# Altium footprint library Resistors.PcbLib: 63 footprints (part 3 of 4)
Each footprint in its own frame and in the unit in brackets; x right, y up, seen from the top. Pads: shape width x height; smd on the part's side, far side on the other; paste and mask are expansions set on the pad; w line width, h text height; cw(c..) or ccw(c..) is an arc to the next point about the centre after c.
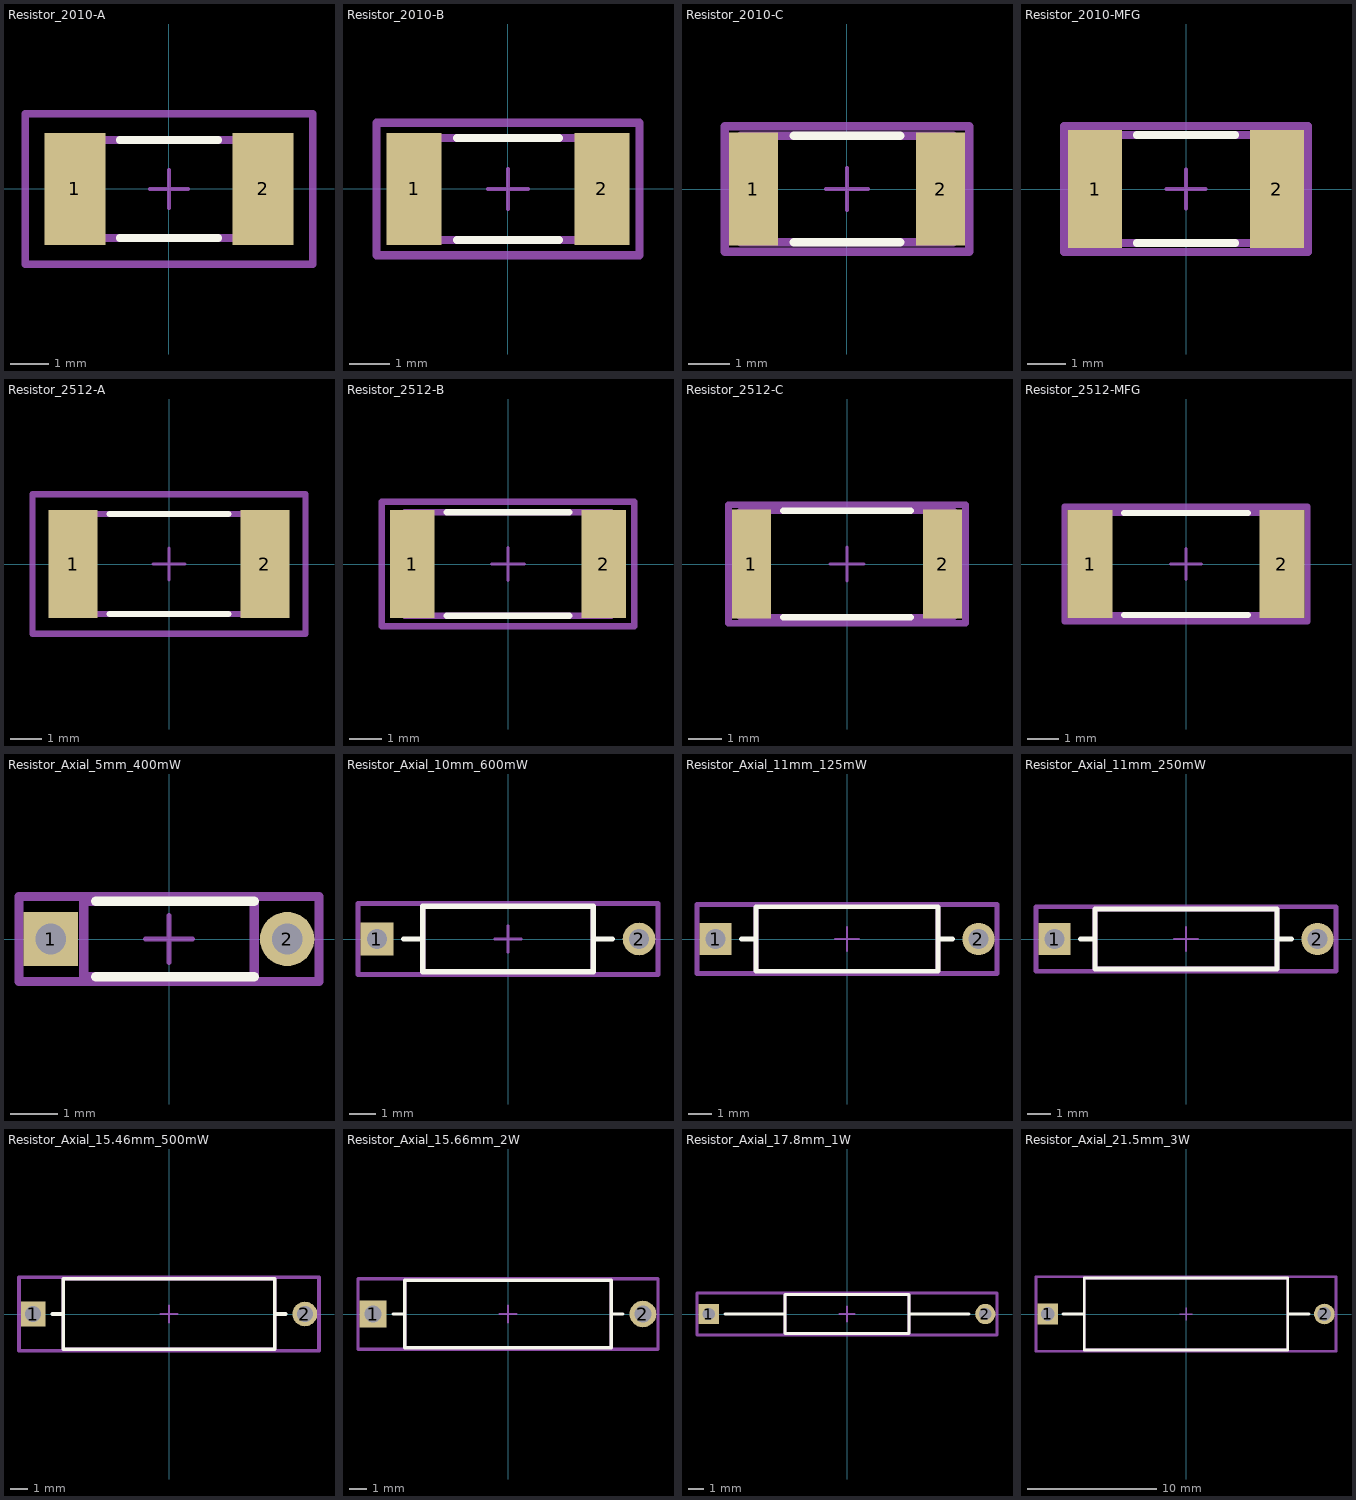
[diagram p2: the footprints below, top view; thin cyan lines are the x and y axes]

## Resistor_2010-A [mm]
pads (2):
  rect 1.57x2.899 smd paste+0 mask+0: 1(-2.435,0) 2(2.435,0)
Top Overlay:
  lines w0.2: -1.275,-1.27 1.275,-1.27 ; -1.275,1.27 1.275,1.27
Top Assembly:
  lines w0.2: -3.719,-1.949 -3.719,1.949 3.719,1.949 3.719,-1.949 -3.719,-1.949
Top 3D Body:
  lines w0.2: -2.54,-1.27 -2.54,1.27 2.54,1.27 2.54,-1.27 -2.54,-1.27
Top Courtyard:
  lines w0.2: -3.719,-1.949 -3.719,1.949 3.719,1.949 3.719,-1.949 -3.719,-1.949
Top Component Center:
  lines w0.1: -0.5,0 0.5,0 -0.5,0 ; 0,-0.5 0,0.5 0,-0.5
3D body "Res_Vishay_Dale_WSL2010R1000FEA18_eec.STEP": height 0.25, standoff 0, extent -3.719,-1.949 3.719,1.949

## Resistor_2010-B [mm]
pads (2):
  rect 1.37x2.799 smd paste+0 mask+0: 1(-2.335,0) 2(2.335,0)
Top Overlay:
  lines w0.2: -1.275,-1.27 1.275,-1.27 ; -1.275,1.27 1.275,1.27
Top Assembly:
  lines w0.2: -3.269,-1.649 3.269,-1.649 3.269,1.649 -3.269,1.649 -3.269,-1.649
Top 3D Body:
  lines w0.2: -2.54,-1.27 2.54,-1.27 2.54,1.27 -2.54,1.27 -2.54,-1.27
Top Courtyard:
  lines w0.2: -3.269,-1.649 3.269,-1.649 3.269,1.649 -3.269,1.649 -3.269,-1.649
Top Component Center:
  lines w0.1: -0.5,0 0.5,0 -0.5,0 ; 0,-0.5 0,0.5 0,-0.5
3D body "Res_Vishay_Dale_WSL2010R1000FEA18_eec.STEP": height 0.25, standoff 0, extent -3.269,-1.649 3.269,1.649

## Resistor_2010-C [mm]
pads (2):
  rect 1.17x2.699 smd paste+0 mask+0: 1(-2.235,0) 2(2.235,0)
Top Overlay:
  lines w0.2: -1.275,-1.27 1.275,-1.27 ; -1.275,1.27 1.275,1.27
Top Assembly:
  lines w0.2: -2.919,-1.497 2.919,-1.497 2.919,1.497 -2.919,1.497 -2.919,-1.497
Top 3D Body:
  lines w0.2: -2.54,-1.27 2.54,-1.27 2.54,1.27 -2.54,1.27 -2.54,-1.27
Top Courtyard:
  lines w0.2: -2.919,-1.497 2.919,-1.497 2.919,1.497 -2.919,1.497 -2.919,-1.497
Top Component Center:
  lines w0.1: -0.5,0 0.5,0 -0.5,0 ; 0,-0.5 0,0.5 0,-0.5
3D body "Res_Vishay_Dale_WSL2010R1000FEA18_eec.STEP": height 0.25, standoff 0, extent -2.919,-1.497 2.919,1.497

## Resistor_2010-MFG [mm]
pads (2):
  rect 1.4x3.05 smd paste+0 mask+0: 1(-2.35,0) 2(2.35,0)
Top Overlay:
  lines w0.2: -1.275,-1.397 1.275,-1.397 ; -1.275,1.397 1.275,1.397
Top Assembly:
  lines w0.2: -3.15,-1.625 -3.15,1.625 3.15,1.625 3.15,-1.625 -3.15,-1.625
Top 3D Body:
  lines w0.2: -2.667,-1.397 -2.667,1.397 2.667,1.397 2.667,-1.397 -2.667,-1.397
Top Courtyard:
  lines w0.2: -3.15,-1.625 -3.15,1.625 3.15,1.625 3.15,-1.625 -3.15,-1.625
Top Component Center:
  lines w0.1: -0.5,0 0.5,0 ; 0,-0.5 0,0.5
3D body "Res_Vishay_Dale_WSL2010R1500FEA18_eec.STEP": height 0.25, standoff 0, extent -3.15,-1.625 3.15,1.625

## Resistor_2512-A [mm]
pads (2):
  rect 1.555x3.408 smd paste+0 mask+0: 1(-3.026,0) 2(3.026,0)
Top Overlay:
  lines w0.2: -1.873,-1.575 1.873,-1.575 ; -1.873,1.575 1.873,1.575
Top Assembly:
  lines w0.2: -4.303,-2.204 4.303,-2.204 4.303,2.204 -4.303,2.204 -4.303,-2.204
Top 3D Body:
  lines w0.2: -3.15,-1.575 3.15,-1.575 3.15,1.575 -3.15,1.575 -3.15,-1.575
Top Courtyard:
  lines w0.2: -4.303,-2.204 4.303,-2.204 4.303,2.204 -4.303,2.204 -4.303,-2.204
Top Component Center:
  lines w0.1: -0.5,0 0.5,0 ; 0,-0.5 0,0.5
3D body "Res_Vishay_CRCW25121K80FKEG_eec.STEP": height 0.25, standoff 0, extent -4.303,-2.204 4.303,2.204

## Resistor_2512-B [mm]
pads (2):
  rect 1.355x3.308 smd paste+0 mask+0: 1(-2.926,0) 2(2.926,0)
Top Overlay:
  lines w0.2: -1.873,-1.575 1.873,-1.575 ; -1.873,1.575 1.873,1.575
Top Assembly:
  lines w0.2: -3.853,-1.904 3.853,-1.904 3.853,1.904 -3.853,1.904 -3.853,-1.904
Top 3D Body:
  lines w0.2: -3.15,-1.575 3.15,-1.575 3.15,1.575 -3.15,1.575 -3.15,-1.575
Top Courtyard:
  lines w0.2: -3.853,-1.904 3.853,-1.904 3.853,1.904 -3.853,1.904 -3.853,-1.904
Top Component Center:
  lines w0.1: -0.5,0 0.5,0 ; 0,-0.5 0,0.5
3D body "Res_Vishay_CRCW25121K80FKEG_eec.STEP": height 0.25, standoff 0, extent -3.853,-1.904 3.853,1.904

## Resistor_2512-C [mm]
pads (2):
  rect 1.155x3.208 smd paste+0 mask+0: 1(-2.826,0) 2(2.826,0)
Top Overlay:
  lines w0.2: -1.873,-1.575 1.873,-1.575 ; -1.873,1.575 1.873,1.575
Top Assembly:
  lines w0.2: -3.503,-1.75 3.503,-1.75 3.503,1.75 -3.503,1.75 -3.503,-1.75
Top 3D Body:
  lines w0.2: -3.15,-1.575 3.15,-1.575 3.15,1.575 -3.15,1.575 -3.15,-1.575
Top Courtyard:
  lines w0.2: -3.503,-1.75 3.503,-1.75 3.503,1.75 -3.503,1.75 -3.503,-1.75
Top Component Center:
  lines w0.1: -0.5,0 0.5,0 ; 0,-0.5 0,0.5
3D body "Res_Vishay_CRCW25121K80FKEG_eec.STEP": height 0.25, standoff 0, extent -3.503,-1.75 3.503,1.75

## Resistor_2512-MFG [mm]
pads (2):
  rect 1.45x3.5 smd paste+0 mask+0: 1(-3.1,0) 2(3.1,0)
Top Overlay:
  lines w0.2: -2,-1.65 2,-1.65 ; -2,1.65 2,1.65
Top Assembly:
  lines w0.2: -3.925,-1.85 3.925,-1.85 3.925,1.85 -3.925,1.85 -3.925,-1.85
Top 3D Body:
  lines w0.2: -3.25,-1.65 3.25,-1.65 3.25,1.65 -3.25,1.65 -3.25,-1.65
Top Courtyard:
  lines w0.2: -3.925,-1.85 3.925,-1.85 3.925,1.85 -3.925,1.85 -3.925,-1.85
Top Component Center:
  lines w0.1: -0.5,0 0.5,0 ; 0,-0.5 0,0.5
3D body "Res_Vishay_CRCW25121K80FKEG_eec.STEP": height 0.25, standoff 0, extent -3.925,-1.85 3.925,1.85

## Resistor_Axial_5mm_400mW [mm]
pads (2):
  rect 1.15x1.15 hole 0.65 paste-2539.97 mask+0: 1(-2.5,0)
  round 1.15 hole 0.65 paste-2539.97 mask+0: 2(2.5,0)
Top Overlay:
  lines w0.2: -1.55,-0.8 1.8,-0.8 ; -1.55,0.8 1.8,0.8
Top Assembly:
  lines w0.2: -3.175,-0.9 3.175,-0.9 3.175,0.9 -3.175,0.9 -3.175,-0.9
Top 3D Body:
  lines w0.2: -1.8,-0.8 1.8,-0.8 1.8,0.8 -1.8,0.8 -1.8,-0.8
Top Courtyard:
  lines w0.2: -3.175,-0.9 3.175,-0.9 3.175,0.9 -3.175,0.9 -3.175,-0.9
Top Component Center:
  lines w0.1: -0.5,0 0.5,0 ; 0,-0.5 0,0.5
3D body "Res_Vishay_MRS16000C2002FCT00_eec.STEP": height 0.25, standoff 0, extent -3.175,-0.9 3.175,0.9

## Resistor_Axial_10mm_600mW [mm]
pads (2):
  rect 1.25x1.25 hole 0.75 paste-2539.97 mask+0: 1(-5,0)
  round 1.25 hole 0.75 paste-2539.97 mask+0: 2(5,0)
Top Overlay:
  lines w0.2: -3.975,0 -3.25,0 ; 3.25,0 3.975,0 ; -3.25,-1.25 -3.25,1.25 3.25,1.25 3.25,-1.25 -3.25,-1.25
Top Assembly:
  lines w0.2: -5.725,-1.35 -5.725,1.35 5.725,1.35 5.725,-1.35 -5.725,-1.35
Top 3D Body:
  lines w0.2: -3.25,-1.25 -3.25,1.25 3.25,1.25 3.25,-1.25 -3.25,-1.25
Top Courtyard:
  lines w0.2: -5.725,-1.35 -5.725,1.35 5.725,1.35 5.725,-1.35 -5.725,-1.35
Top Component Center:
  lines w0.1: -0.5,0 0.5,0 ; 0,-0.5 0,0.5
3D body "Res_Vishay_MRS25-1K5_eec.STEP": height 0.25, standoff 0, extent -5.725,-1.35 5.725,1.35

## Resistor_Axial_11mm_125mW [mm]
pads (2):
  rect 1.35x1.35 hole 0.85 paste-2539.97 mask+0: 1(-5.5,0)
  round 1.35 hole 0.85 paste-2539.97 mask+0: 2(5.5,0)
Top Overlay:
  lines w0.2: -4.425,0 -3.81,0 ; 3.81,0 4.425,0 ; -3.81,-1.345 3.81,-1.345 3.81,1.345 -3.81,1.345 -3.81,-1.345
Top Assembly:
  lines w0.2: -6.275,-1.445 6.275,-1.445 6.275,1.445 -6.275,1.445 -6.275,-1.445
Top 3D Body:
  lines w0.2: -3.81,-1.345 3.81,-1.345 3.81,1.345 -3.81,1.345 -3.81,-1.345
Top Courtyard:
  lines w0.2: -6.275,-1.445 6.275,-1.445 6.275,1.445 -6.275,1.445 -6.275,-1.445
Top Component Center:
  lines w0.1: -0.5,0 0.5,0 ; 0,-0.5 0,0.5
3D body "Res_Vishay_RNC55H1002FSB14_eec.STEP": height 0.25, standoff 0, extent -6.275,-1.445 6.275,1.445

## Resistor_Axial_11mm_250mW [mm]
pads (2):
  rect 1.35x1.35 hole 0.85 paste-2539.97 mask+0: 1(-5.5,0)
  round 1.35 hole 0.85 paste-2539.97 mask+0: 2(5.5,0)
Top Overlay:
  lines w0.2: -4.425,0 -3.81,0 ; 3.81,0 4.425,0 ; -3.81,-1.25 -3.81,1.25 3.81,1.25 3.81,-1.25 -3.81,-1.25
Top Assembly:
  lines w0.2: -6.275,-1.35 -6.275,1.35 6.275,1.35 6.275,-1.35 -6.275,-1.35
Top 3D Body:
  lines w0.2: -3.81,-1.25 -3.81,1.25 3.81,1.25 3.81,-1.25 -3.81,-1.25
Top Courtyard:
  lines w0.2: -6.275,-1.35 -6.275,1.35 6.275,1.35 6.275,-1.35 -6.275,-1.35
Top Component Center:
  lines w0.1: -0.5,0 0.5,0 ; 0,-0.5 0,0.5
3D body "Res_Vishay_RLR07C1003FPRE5_eec.STEP": height 0.25, standoff 0, extent -6.275,-1.35 6.275,1.35

## Resistor_Axial_15.46mm_500mW [mm]
pads (2):
  rect 1.4x1.4 hole 0.9 paste-2539.97 mask+0: 1(-7.73,0)
  round 1.4 hole 0.9 paste-2539.97 mask+0: 2(7.73,0)
Top Overlay:
  lines w0.2: -6.63,0 -6,0 ; 6,0 6.63,0 ; -6,-2 -6,2 6,2 6,-2 -6,-2
Top Assembly:
  lines w0.2: -8.53,-2.1 -8.53,2.1 8.53,2.1 8.53,-2.1 -8.53,-2.1
Top 3D Body:
  lines w0.2: -6,-2 -6,2 6,2 6,-2 -6,-2
Top Courtyard:
  lines w0.2: -8.53,-2.1 -8.53,2.1 8.53,2.1 8.53,-2.1 -8.53,-2.1
Top Component Center:
  lines w0.1: -0.5,0 0.5,0 ; 0,-0.5 0,0.5
3D body "Res_Vishay_HVR3700001004FR500_eec.STEP": height 0.25, standoff 0, extent -8.53,-2.1 8.53,2.1

## Resistor_Axial_15.66mm_2W [mm]
pads (2):
  rect 1.55x1.55 hole 1 paste-2539.97 mask+0: 1(-7.83,0)
  round 1.55 hole 1 paste-2539.97 mask+0: 2(7.83,0)
Top Overlay:
  lines w0.2: -6.655,0 -6,0 ; 6,0 6.655,0 ; -6,-1.95 6,-1.95 6,1.95 -6,1.95 -6,-1.95
Top Assembly:
  lines w0.2: -8.705,-2.05 8.705,-2.05 8.705,2.05 -8.705,2.05 -8.705,-2.05
Top 3D Body:
  lines w0.2: -6,-1.95 6,-1.95 6,1.95 -6,1.95 -6,-1.95
Top Courtyard:
  lines w0.2: -8.705,-2.05 8.705,-2.05 8.705,2.05 -8.705,2.05 -8.705,-2.05
Top Component Center:
  lines w0.1: -0.5,0 0.5,0 ; 0,-0.5 0,0.5
3D body "Res_Vishay_PR02000201003JA100_eec.STEP": height 0.25, standoff 0, extent -8.705,-2.05 8.705,2.05

## Resistor_Axial_17.8mm_1W [mm]
pads (2):
  rect 1.3x1.3 hole 0.8 paste-2539.97 mask+0: 1(-8.9,0)
  round 1.3 hole 0.8 paste-2539.97 mask+0: 2(8.9,0)
Top Overlay:
  lines w0.2: -7.85,0 -4,0 ; 4,0 7.85,0 ; -4,-1.25 -4,1.25 4,1.25 4,-1.25 -4,-1.25
Top Assembly:
  lines w0.2: -9.65,-1.35 -9.65,1.35 9.65,1.35 9.65,-1.35 -9.65,-1.35
Top 3D Body:
  lines w0.2: -4,-1.25 -4,1.25 4,1.25 4,-1.25 -4,-1.25
Top Courtyard:
  lines w0.2: -9.65,-1.35 -9.65,1.35 9.65,1.35 9.65,-1.35 -9.65,-1.35
Top Component Center:
  lines w0.1: -0.5,0 0.5,0 ; 0,-0.5 0,0.5
3D body "Res_Vishay_PR01000101009JR500_eec.STEP": height 0.25, standoff 0, extent -9.65,-1.35 9.65,1.35

## Resistor_Axial_21.5mm_3W [mm]
pads (2):
  rect 1.6x1.6 hole 1.05 paste-2539.97 mask+0: 1(-10.751,0)
  round 1.6 hole 1.05 paste-2539.97 mask+0: 2(10.751,0)
Top Overlay:
  lines w0.2: -9.551,0 -7.9,0 ; 7.9,0 9.551,0 ; -7.9,-2.796 7.9,-2.796 7.9,2.796 -7.9,2.796 -7.9,-2.796
Top Assembly:
  lines w0.2: -11.651,-2.896 11.651,-2.896 11.651,2.896 -11.651,2.896 -11.651,-2.896
Top 3D Body:
  lines w0.2: -7.9,-2.796 7.9,-2.796 7.9,2.796 -7.9,2.796 -7.9,-2.796
Top Courtyard:
  lines w0.2: -11.651,-2.896 11.651,-2.896 11.651,2.896 -11.651,2.896 -11.651,-2.896
Top Component Center:
  lines w0.1: -0.5,0 0.5,0 ; 0,-0.5 0,0.5
3D body "Res_Vishay_CW02B8K200JE12_eec.STEP": height 0.25, standoff 0, extent -11.651,-2.896 11.651,2.896